# Altium footprint library LUMI_Handy_Soldering_LIB.PcbLib: 562 footprints (part 32 of 36)
Each footprint in its own frame and in the unit in brackets; x right, y up, seen from the top. Pads: shape width x height; smd on the part's side, far side on the other; paste and mask are expansions set on the pad; w line width, h text height; cw(c..) or ccw(c..) is an arc to the next point about the centre after c.
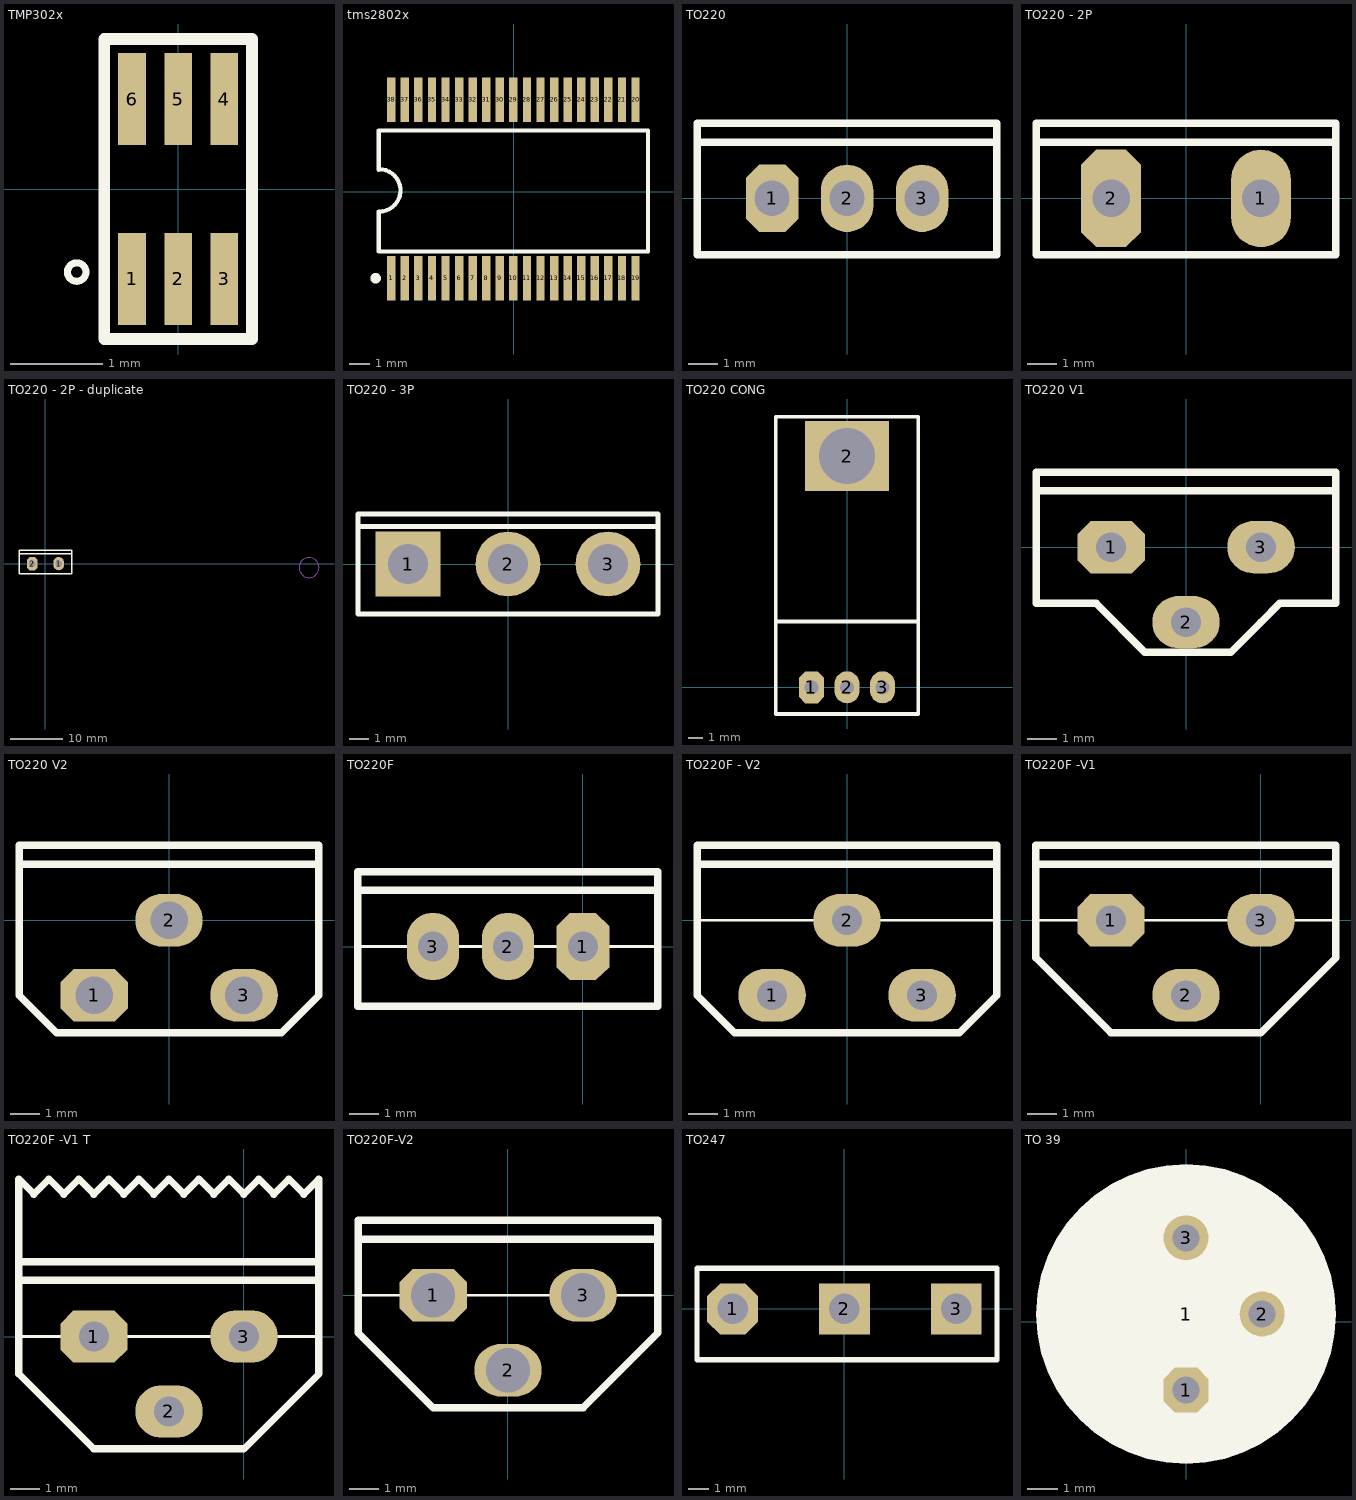
[diagram p31: the footprints below, top view; thin cyan lines are the x and y axes]

## TMP302x [mm]
pads (6):
  rect 0.3x1 smd: 1(-0.5,-0.975) 2(0,-0.975) 3(0.5,-0.975) 4(0.5,0.975) 5(0,0.975) 6(-0.5,0.975)
Top Overlay:
  circle w0.076: c-1.1,-0.9 r0.1
  lines w0.127: -0.8,-1.625 0.8,-1.625 0.8,1.625 -0.8,1.625 -0.8,-1.625
3D body: height 0.58, standoff 0, extent -0.8,-0.813 0.8,0.813

## tms2802x [mm]
pads (38):
  rect 0.4x2.15 smd: 1(-5.875,-4.132) 2(-5.225,-4.132) 3(-4.575,-4.132) 4(-3.925,-4.132) 5(-3.275,-4.132) 6(-2.625,-4.132) 7(-1.975,-4.132) 8(-1.325,-4.132) 9(-0.675,-4.132) 10(-0.025,-4.132) 11(0.625,-4.132) 12(1.275,-4.132) 13(1.925,-4.132) 14(2.575,-4.132) 15(3.225,-4.132) 16(3.875,-4.132) 17(4.525,-4.132) 18(5.175,-4.132) 19(5.825,-4.132) 20(5.825,4.418) 21(5.175,4.418) 22(4.525,4.418) 23(3.875,4.418) 24(3.225,4.418) 25(2.575,4.418) 26(1.925,4.418) 27(1.275,4.418) 28(0.625,4.418) 29(-0.025,4.418) 30(-0.675,4.418) 31(-1.325,4.418) 32(-1.975,4.418) 33(-2.625,4.418) 34(-3.275,4.418) 35(-3.925,4.418) 36(-4.575,4.418) 37(-5.225,4.418) 38(-5.875,4.418)
Top Overlay:
  circle w0.25: c-6.625,-4.132 r0.125
  lines w0.2: -6.475,-0.94 -6.475,-2.857 6.425,-2.857 6.425,2.943 -6.475,2.943 -6.475,1.067 ; -6.452,-0.94 ccw(c-6.452,0.076) -6.452,1.092
3D body: height 1.01, standoff -0.09, extent -6.326,-3.923 6.274,4.177

## TO220 [mil]
pads (3):
  oct 70x90 hole 47.24: 1(-100,0)
  oval 70x90 hole 47.24: 2(0,0) 3(100,0)
Top Overlay:
  lines w10: -200,75 200,75 ; -200,-75 -200,100 200,100 200,-75 75,-75 -75,-75 -200,-75
3D body: height 854.72, standoff -300, extent -215.73,-55.65 225.73,129

## TO220 - 2P [mil]
pads (2):
  oval 80x130 hole 50: 1(100,0)
  oct 80x130 hole 50: 2(-100,0)
Top Overlay:
  lines w10: -200,75 200,75 ; -200,-75 -200,100 200,100 200,-75 75,-75 -75,-75 -200,-75
3D body: height 854.72, standoff -300, extent -220.73,-84.65 220.73,100

## TO220 - 2P - duplicate [mil]
pads (2):
  oval 80x100 hole 50: 1(100,0)
  oct 80x100 hole 50: 2(-100,0)
Top Overlay:
  lines w10: -200,75 200,75 ; -200,-75 -75,-75 75,-75 200,-75 200,100 -200,100 -200,-75
Mechanical 1:
  circle w1: c1995,-30 r75
3D body: height 50, standoff 0, extent 1800,-495 2200,100
3D body: height 200, standoff 2, extent 1800,-500 2200,-150
3D body: height -120, standoff -140, extent 2075,-900 2125,-500
3D body: height -120, standoff -140, extent 1875,-900 1925,-500
3D body: height 854.72, standoff -300, extent -220.73,-84.65 220.73,100

## TO220 - 3P [mil]
pads (3):
  rect 130x130 hole 80: 1(-200,0)
  round 130 hole 80: 2(0,0) 3(200,0)
Top Overlay:
  lines w10: -300,75 300,75 ; -300,-100 -100,-100 50,-100 300,-100 300,100 -300,100 -300,-100
3D body: height 1250, standoff -390, extent -314,-90 316,108

## TO220 CONG [mm]
pads (4):
  oct 1.778x2.286 hole 1: 1(-2.54,0)
  oval 1.778x2.286 hole 1: 2(0,0) 3(2.54,0)
  rect 6x5 hole 4: 2(0,16.51)
Top Overlay:
  circle w0.254: c0,16.51 r2
  lines w0.254: -5.08,4.699 5.08,4.699 ; -5.08,-1.905 -1.905,-1.905 1.905,-1.905 5.08,-1.905 5.08,19.304 -5.08,19.304 -5.08,-1.905
3D body: height 4.45, standoff -1.79, extent -5.08,-0.226 5.08,19.054

## TO220 V1 [mil]
pads (3):
  oct 90x70 hole 39.37: 1(-100,0)
  oval 90x70 hole 39.37: 2(0,-100) 3(100,0)
Top Overlay:
  lines w10: -200,75 200,75 ; -200,-75 -200,100 200,100 200,-75 125,-75 100,-100 60,-140 -55,-140 -120,-75 -200,-75

## TO220 V2 [mil]
pads (3):
  oct 90x70 hole 50: 1(-100,-100)
  oval 90x70 hole 50: 2(0,0) 3(100,-100)
Top Overlay:
  lines w10: -200,75 200,75 ; -200,-100 -200,100 200,100 200,-100 150,-150 50,-150 -65,-150 -150,-150 -200,-100
3D body: height 854.72, standoff -300, extent -220.73,-58.86 220.73,125.79

## TO220F [mil]
pads (3):
  oct 70x90 hole 39.37: 1(0,0)
  oval 70x90 hole 39.37: 2(-100,0) 3(-200,0)
Top Overlay:
  lines w3.94: -300,0 100,0
  lines w10: -300,75 100,75 ; -300,-80 -300,100 100,100 100,-80 -300,-80
3D body: height 854.72, standoff -300, extent -320.73,-58.86 120.73,125.79
3D body: height 854.72, standoff -300, extent -320.74,-58.86 120.72,125.79

## TO220F - V2 [mil]
pads (3):
  oval 90x70 hole 39.37: 1(-100,-100) 2(0,0) 3(100,-100)
Top Overlay:
  lines w3.94: -200,0 200,0
  lines w10: -200,75 200,75 ; -200,-100 -200,-80 -200,100 200,100 200,-80 200,-100 150,-150 -150,-150 -200,-100

## TO220F -V1 [mil]
pads (3):
  oct 90x70 hole 39.37: 1(-200,0)
  oval 90x70 hole 39.37: 2(-100,-100) 3(0,0)
Top Overlay:
  lines w3.94: -300,0 100,0
  lines w10: -300,75 100,75 ; -300,-50 -300,100 100,100 100,-50 0,-150 -200,-150 -300,-50
3D body: height 780.24, standoff -352.83, extent -294.88,-77.16 94.89,100

## TO220F -V1 T [mil]
pads (3):
  oct 90x70 hole 39.37: 1(-200,0)
  oval 90x70 hole 39.37: 2(-100,-100) 3(0,0)
Top Overlay:
  lines w3.94: -300,0 100,0
  lines w10: -300,75 100,75 ; -300,100 -300,-50 -200,-150 0,-150 100,-50 100,100 ; -300,100 100,100 ; -300,100 -300,210 -280,190 -260,210 -240,190 -220,210 -200,190 -180,210 -160,190 -140,210 -120,190 -100,210 -80,190 -60,210 -40,190 -20,210 0,190 20,210 40,190 60,210 80,190 100,210 100,100
3D body: height 780.24, standoff -352.83, extent -294.88,-76.31 94.88,100.86

## TO220F-V2 [mil]
pads (3):
  oct 90x70 hole 59.06: 1(-100,0)
  oval 90x70 hole 59.06: 2(0,-100) 3(100,0)
Top Overlay:
  lines w3.94: -200,0 200,0
  lines w10: -200,75 200,75 ; -200,-50 -200,100 200,100 200,-50 100,-150 -100,-150 -200,-50
3D body: height 780.24, standoff -352.83, extent -194.88,-77.16 194.89,100.01

## TO247 [mil]
pads (3):
  oct 100x100 hole 60: 1(-220,0)
  rect 100x100 hole 60: 2(0,0) 3(220,0)
Top Overlay:
  lines w10: -290,-100 -290,80 300,80 300,-100 100,-100 -100,-100 -290,-100
3D body: height 1010, standoff -410, extent -300,-100 300,80

## TO 39 [mm]
pads (4):
  oct 1.5x1.5 hole 0.9: 1(0,-2.286)
  round 10 on Top Overlay: 1(0,0.254)
  round 1.5 hole 0.9: 2(2.54,0.254) 3(0,2.794)
Top Overlay:
  circle w0.254: c-0.039,0.254 r4.6
3D body: height 5.2, standoff -3.13, extent -4.69,-4.445 4.699,4.953